# Altium footprint library 4.01-SH1.0连接器.PcbLib: 20 footprints (part 2 of 2)
Each footprint in its own frame and in the unit in brackets; x right, y up, seen from the top. Pads: shape width x height; smd on the part's side, far side on the other; paste and mask are expansions set on the pad; w line width, h text height; cw(c..) or ccw(c..) is an arc to the next point about the centre after c.
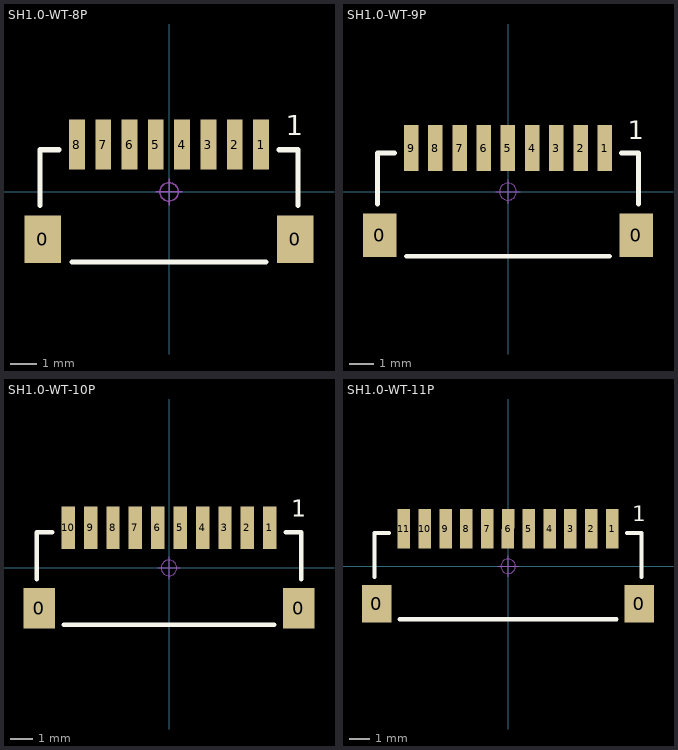
[diagram p1: the footprints below, top view; thin cyan lines are the x and y axes]

## SH1.0-WT-8P [mm] "SH1.0连接器-卧贴-8P                联系卖家 免费查找封装"
pads (10):
  rect 1.4x1.8 smd: 0(-4.801,-1.799) 0(4.801,-1.801)
  rect 0.6x1.9 smd: 1(3.499,1.801) 2(2.499,1.801) 3(1.499,1.801) 4(0.499,1.801) 5(-0.501,1.801) 6(-1.501,1.801) 7(-2.501,1.801) 8(-3.501,1.801)
Top Overlay:
  lines w0.2: -4.901,-0.508 -4.901,1.601 -4.191,1.601 ; -3.683,-2.667 3.683,-2.667 ; 4.191,1.599 4.801,1.599 4.901,1.599 4.901,1.499 4.901,-0.508
  text "1" at 4.445,2.159 h0.76
Mechanical 15:
  circle w0.05: c0,0 r0.35
  lines w0.05: -0.5,0 0.5,0 ; 0,-0.5 0,0.5
3D body "SH1.0-WT-8P.STEP": height 2.9, standoff 0, extent -5,-2.6 5,2.35

## SH1.0-WT-9P [mm] "SH1.0连接器-卧贴-9P                 联系卖家 免费查找封装"
pads (11):
  rect 1.4x1.8 smd: 0(-5.301,-1.799) 0(5.301,-1.801)
  rect 0.6x1.9 smd: 1(3.999,1.801) 2(2.999,1.801) 3(1.999,1.801) 4(0.999,1.801) 5(-0.001,1.801) 6(-1.001,1.801) 7(-2.001,1.801) 8(-3.001,1.801) 9(-4.001,1.801)
Top Overlay:
  lines w0.2: -5.401,-0.508 -5.401,1.601 -4.699,1.601 ; -4.191,-2.667 4.191,-2.667 ; 4.699,1.599 5.301,1.599 5.401,1.599 5.401,1.499 5.401,-0.508
  text "1" at 4.953,2.159 h0.76
Mechanical 15:
  circle w0.05: c0,0 r0.35
  lines w0.05: -0.5,0 0.5,0 ; 0,-0.5 0,0.5
3D body "SH1.0-WT-9P.STEP": height 2.9, standoff 0, extent -5.524,-2.599 5.476,2.351

## SH1.0-WT-10P [mm] "SH1.0连接器-卧贴-10P                联系卖家 免费查找封装"
pads (12):
  rect 1.4x1.8 smd: 0(-5.8,-1.8) 0(5.8,-1.8)
  rect 0.6x1.9 smd: 1(4.5,1.8) 2(3.5,1.8) 3(2.5,1.8) 4(1.5,1.8) 5(0.5,1.8) 6(-0.5,1.8) 7(-1.5,1.8) 8(-2.5,1.8) 9(-3.5,1.8) 10(-4.5,1.8)
Top Overlay:
  lines w0.2: -5.9,-0.508 -5.9,1.6 -5.207,1.6 ; -4.699,-2.54 4.699,-2.54 ; 5.207,1.6 5.9,1.6 5.9,-0.508
  text "1" at 5.461,2.286 h0.76
Mechanical 15:
  circle w0.05: c0,0 r0.35
  lines w0.05: -0.5,0 0.5,0 ; 0,-0.5 0,0.5
3D body "SH1.0-WT-10P.STEP": height 2.9, standoff 0, extent -6,-2.5 6,2.45

## SH1.0-WT-11P [mm] "SH1.0连接器-卧贴-11P                  联系卖家 免费查找封装"
pads (13):
  rect 1.4x1.8 smd: 0(-6.3,-1.8) 0(6.3,-1.8)
  rect 0.6x1.9 smd: 1(5,1.8) 2(4,1.8) 3(3,1.8) 4(2,1.8) 5(1,1.8) 6(0,1.8) 7(-1,1.8) 8(-2,1.8) 9(-3,1.8) 10(-4,1.8) 11(-5,1.8)
Top Overlay:
  lines w0.2: -6.4,-0.508 -6.4,1.6 -5.707,1.6 ; -5.199,-2.54 5.207,-2.54 ; 5.707,1.6 6.4,1.6 6.4,-0.508
  text "1" at 5.969,2.159 h0.76
Mechanical 15:
  circle w0.05: c0.008,0 r0.35
  lines w0.05: -0.492,0 0.508,0 ; 0.008,-0.5 0.008,0.5
3D body "SH1.0-WT-11P.STEP": height 2.9, standoff 0, extent -6.5,-2.5 6.5,2.45